# Altium footprint library Connectors.PcbLib: 101 footprints (part 1 of 7)
Each footprint in its own frame and in the unit in brackets; x right, y up, seen from the top. Pads: shape width x height; smd on the part's side, far side on the other; paste and mask are expansions set on the pad; w line width, h text height; cw(c..) or ccw(c..) is an arc to the next point about the centre after c.
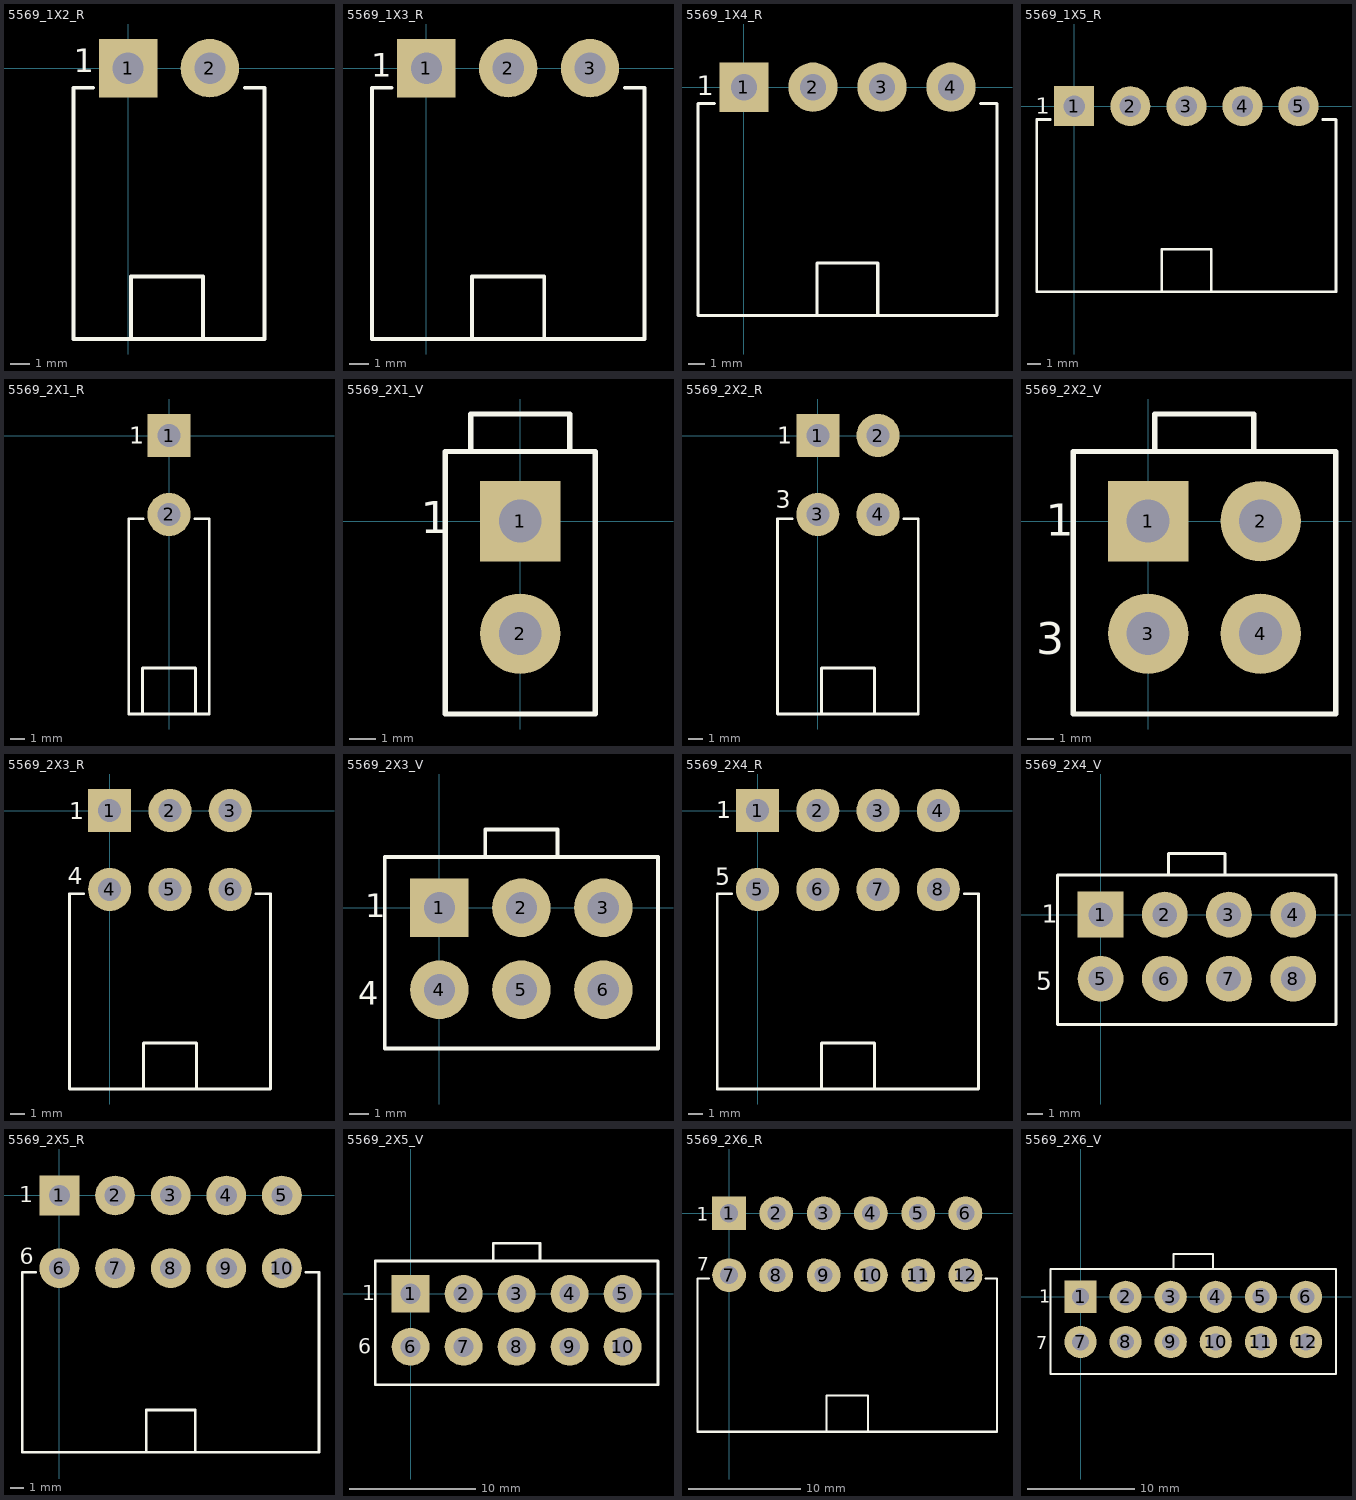
[diagram p0: the footprints below, top view; thin cyan lines are the x and y axes]

## 5569_1X2_R [mm] "5569 Connector, 2-Pin, Single row, Right Angle"
pads (2):
  rect 3x3 hole 1.6 paste+0 mask+0.1: 1(0,0)
  round 3 hole 1.6 paste+0 mask+0.1: 2(4.2,0)
Top Overlay:
  lines w0.2: -1.8,-1 -2.8,-1 -2.8,-13.9 7,-13.9 7,-1 6,-1 ; 0.15,-13.9 0.15,-10.7 3.85,-10.7 3.85,-13.885
  text "1" at -2.79,-0.21 h1.2
3D body: height 6.8, standoff 5.4, extent 0.25,-13.8 3.75,-10.8
3D body: height 5.4, standoff 0, extent -2.7,-13.8 6.9,-1.1

## 5569_1X3_R [mm] "5569 Connector, 3-Pin, Single row, Right Angle"
pads (3):
  rect 3x3 hole 1.6 paste+0 mask+0.1: 1(0,0)
  round 3 hole 1.6 paste+0 mask+0.1: 2(4.2,0) 3(8.4,0)
Top Overlay:
  lines w0.2: -1.8,-1 -2.8,-1 -2.8,-13.9 11.2,-13.9 11.2,-1 10.2,-1 ; 2.35,-13.9 2.35,-10.7 6.05,-10.7 6.05,-13.885
  text "1" at -2.82,-0.44 h1.2
3D body "039303035.stp": height 7.2, standoff -3.6, extent -2.7,-13.8 11.1,0.25

## 5569_1X4_R [mm] "5569 Connector, 4-Pin, Single row, Right Angle"
pads (4):
  rect 3x3 hole 1.6 paste+0 mask+0.1: 1(0,0)
  round 3 hole 1.6 paste+0 mask+0.1: 2(4.2,0) 3(8.4,0) 4(12.6,0)
Top Overlay:
  lines w0.2: -1.8,-1 -2.8,-1 -2.8,-13.9 15.4,-13.9 15.4,-1 14.4,-1 ; 4.45,-13.9 4.45,-10.7 8.15,-10.7 8.15,-13.885
  text "1" at -2.86,-0.48 h1.2
3D body "039303045.stp": height 7.2, standoff -3.5, extent -2.7,-13.8 15.3,0.6

## 5569_1X5_R [mm] "5569 Connector, 5-Pin, Single row, Right Angle"
pads (5):
  rect 3x3 hole 1.6 paste+0 mask+0.1: 1(0,0)
  round 3 hole 1.6 paste+0 mask+0.1: 2(4.2,0) 3(8.4,0) 4(12.6,0) 5(16.8,0)
Top Overlay:
  lines w0.2: -1.8,-1 -2.8,-1 -2.8,-13.9 19.6,-13.9 19.6,-1 18.6,-1 ; 6.55,-13.9 6.55,-10.7 10.25,-10.7 10.25,-13.885
  text "1" at -2.86,-0.57 h1.2
3D body "039303055.stp": height 7.2, standoff -3.5, extent -2.7,-13.8 19.5,0.6

## 5569_2X1_R [mm] "5569 Connector, 1-Pin, Dual row, Right Angle"
pads (2):
  rect 3x3 hole 1.6 paste+0 mask+0.1: 1(0,0)
  round 3 hole 1.6 paste+0 mask+0.1: 2(0,-5.5)
Top Overlay:
  lines w0.2: -1.85,-19.4 -1.85,-16.2 1.85,-16.2 1.85,-19.385 ; -1.8,-5.8 -2.8,-5.8 -2.8,-19.4 2.8,-19.4 2.8,-5.8 1.8,-5.8
  text "1" at -2.76,-0.56 h1.2
3D body "874270202.stp": height 11.4, standoff -3.3, extent -3.3,-19.385 3.3,0.55

## 5569_2X1_V [mm] "5569 Connector, 1-Pin, Dual row, Vertical"
pads (2):
  rect 3x3 hole 1.6 paste+0 mask+0.1: 1(0,0)
  round 3 hole 1.6 paste+0 mask+0.1: 2(0,-4.2)
Top Overlay:
  lines w0.2: -1.85,2.6 -1.85,4 1.85,4 1.85,2.6 ; -2.8,-7.2 -2.8,2.6 2.8,2.6 2.8,-7.2 -2.8,-7.2
  text "1" at -3.71,-0.46 h1.2
3D body "874270242.stp": height 13.5, standoff -3.3, extent -3.3,-7.5 3.3,3.9

## 5569_2X2_R [mm] "5569 Connector, 2-Pin, Dual row, Right Angle"
pads (4):
  rect 3x3 hole 1.6 paste+0 mask+0.1: 1(0,0)
  round 3 hole 1.6 paste+0 mask+0.1: 2(4.2,0) 3(0,-5.5) 4(4.2,-5.5)
Top Overlay:
  lines w0.2: -1.8,-5.8 -2.8,-5.8 -2.8,-19.4 7,-19.4 7,-5.8 6,-5.8 ; 0.25,-19.4 0.25,-16.2 3.95,-16.2 3.95,-19.385
  text "3" at -2.93,-5.02 h1.2
  text "1" at -2.82,-0.58 h1.2
3D body "874270402.stp": height 11.4, standoff -3.3, extent -3.3,-19.385 7.5,0.55

## 5569_2X2_V [mm] "5569 Connector, 2-Pin, Dual row, Vertical"
pads (4):
  rect 3x3 hole 1.6 paste+0 mask+0.1: 1(0,0)
  round 3 hole 1.6 paste+0 mask+0.1: 2(4.2,0) 3(0,-4.2) 4(4.2,-4.2)
Top Overlay:
  lines w0.2: 0.25,2.6 0.25,4 3.95,4 3.95,2.6 ; -2.8,-7.2 -2.8,2.6 7,2.6 7,-7.2 -2.8,-7.2
  text "3" at -4.17,-4.97 h1.2
  text "1" at -3.82,-0.55 h1.2
3D body "874270442.stp": height 13.5, standoff -2.1, extent -3.3,-7.5 7.5,3.9

## 5569_2X3_R [mm] "5569 Connector, 3-Pin, Dual row, Right Angle"
pads (6):
  rect 3x3 hole 1.6 paste+0 mask+0.1: 1(0,0)
  round 3 hole 1.6 paste+0 mask+0.1: 2(4.2,0) 3(8.4,0) 4(0,-5.5) 5(4.2,-5.5) 6(8.4,-5.5)
Top Overlay:
  lines w0.2: -1.8,-5.8 -2.8,-5.8 -2.8,-19.4 11.2,-19.4 11.2,-5.8 10.2,-5.8 ; 2.35,-19.4 2.35,-16.2 6.05,-16.2 6.05,-19.385
  text "4" at -2.93,-5.14 h1.2
  text "1" at -2.81,-0.61 h1.2
3D body "874270602.stp": height 11.4, standoff -3.3, extent -3.3,-19.385 11.7,0.55

## 5569_2X3_V [mm] "5569 Connector, 3-Pin, Dual row, Vertical"
pads (6):
  rect 3x3 hole 1.6 paste+0 mask+0.1: 1(0,0)
  round 3 hole 1.6 paste+0 mask+0.1: 2(4.2,0) 3(8.4,0) 4(0,-4.2) 5(4.2,-4.2) 6(8.4,-4.2)
Top Overlay:
  lines w0.2: 2.35,2.6 2.35,4 6.05,4 6.05,2.6 ; -2.8,-7.2 -2.8,2.6 11.2,2.6 11.2,-7.2 -2.8,-7.2
  text "4" at -4.17,-4.98 h1.2
  text "1" at -3.8,-0.48 h1.2
3D body "874270642.stp": height 13.5, standoff -3.3, extent -3.3,-7.5 11.7,3.9

## 5569_2X4_R [mm] "5569 Connector, 4-Pin, Dual row, Right Angle"
pads (8):
  rect 3x3 hole 1.6 paste+0 mask+0.1: 1(0,0)
  round 3 hole 1.6 paste+0 mask+0.1: 2(4.2,0) 3(8.4,0) 4(12.6,0) 5(0,-5.5) 6(4.2,-5.5) 7(8.4,-5.5) 8(12.6,-5.5)
Top Overlay:
  lines w0.2: -1.8,-5.8 -2.8,-5.8 -2.8,-19.4 15.4,-19.4 15.4,-5.8 14.4,-5.8 ; 4.45,-19.4 4.45,-16.2 8.15,-16.2 8.15,-19.385
  text "1" at -2.87,-0.55 h1.2
  text "5" at -2.93,-5.17 h1.2
3D body "874270802.stp": height 11.4, standoff -3.3, extent -3.3,-19.385 15.9,0.55

## 5569_2X4_V [mm] "5569 Connector, 4-Pin, Dual row, Vertical"
pads (8):
  rect 3x3 hole 1.6 paste+0 mask+0.1: 1(0,0)
  round 3 hole 1.6 paste+0 mask+0.1: 2(4.2,0) 3(8.4,0) 4(12.6,0) 5(0,-4.2) 6(4.2,-4.2) 7(8.4,-4.2) 8(12.6,-4.2)
Top Overlay:
  lines w0.2: 4.45,2.6 4.45,4 8.15,4 8.15,2.6 ; -2.8,-7.2 -2.8,2.6 15.4,2.6 15.4,-7.2 -2.8,-7.2
  text "1" at -3.83,-0.55 h1.2
  text "5" at -4.22,-4.91 h1.2
3D body "874270842.stp": height 13.5, standoff -3.3, extent -3.3,-7.5 15.9,3.9

## 5569_2X5_R [mm] "5569 Connector, 5-Pin, Dual row, Right Angle"
pads (10):
  rect 3x3 hole 1.6 paste+0 mask+0.1: 1(0,0)
  round 3 hole 1.6 paste+0 mask+0.1: 2(4.2,0) 3(8.4,0) 4(12.6,0) 5(16.8,0) 6(0,-5.5) 7(4.2,-5.5) 8(8.4,-5.5) 9(12.6,-5.5) 10(16.8,-5.5)
Top Overlay:
  lines w0.2: -1.8,-5.8 -2.8,-5.8 -2.8,-19.4 19.6,-19.4 19.6,-5.8 18.6,-5.8 ; 6.55,-19.4 6.55,-16.2 10.25,-16.2 10.25,-19.385
  text "6" at -2.98,-5.19 h1.2
  text "1" at -3.05,-0.52 h1.2
3D body "874271002.stp": height 11.4, standoff -3.3, extent -3.3,-19.385 20.1,0.55

## 5569_2X5_V [mm] "5569 Connector, 5-Pin, Dual row, Vertical"
pads (10):
  rect 3x3 hole 1.6 paste+0 mask+0.1: 1(0,0)
  round 3 hole 1.6 paste+0 mask+0.1: 2(4.2,0) 3(8.4,0) 4(12.6,0) 5(16.8,0) 6(0,-4.2) 7(4.2,-4.2) 8(8.4,-4.2) 9(12.6,-4.2) 10(16.8,-4.2)
Top Overlay:
  lines w0.2: 6.55,2.6 6.55,4 10.25,4 10.25,2.6 ; -2.8,-7.2 -2.8,2.6 19.6,2.6 19.6,-7.2 -2.8,-7.2
  text "1" at -3.84,-0.51 h1.2
  text "6" at -4.17,-4.76 h1.2
3D body "874271042.stp": height 13.5, standoff -3.3, extent -3.3,-7.5 20.1,3.9

## 5569_2X6_R [mm] "5569 Connector, 6-Pin, Dual row, Right Angle"
pads (12):
  rect 3x3 hole 1.6 paste+0 mask+0.1: 1(0,0)
  round 3 hole 1.6 paste+0 mask+0.1: 2(4.2,0) 3(8.4,0) 4(12.6,0) 5(16.8,0) 6(21,0) 7(0,-5.5) 8(4.2,-5.5) 9(8.4,-5.5) 10(12.6,-5.5) 11(16.8,-5.5) 12(21,-5.5)
Top Overlay:
  lines w0.2: -1.8,-5.8 -2.8,-5.8 -2.8,-19.4 23.8,-19.4 23.8,-5.8 22.8,-5.8 ; 8.65,-19.4 8.65,-16.2 12.35,-16.2 12.35,-19.385
  text "7" at -2.84,-5.13 h1.2
  text "1" at -2.85,-0.65 h1.2
3D body "874271202.stp": height 11.4, standoff -3.3, extent -3.3,-19.385 24.3,0.55

## 5569_2X6_V [mm] "5569 Connector, 6-Pin, Dual row, Vertical"
pads (12):
  rect 3x3 hole 1.6 paste+0 mask+0.1: 1(0,0)
  round 3 hole 1.6 paste+0 mask+0.1: 2(4.2,0) 3(8.4,0) 4(12.6,0) 5(16.8,0) 6(21,0) 7(0,-4.2) 8(4.2,-4.2) 9(8.4,-4.2) 10(12.6,-4.2) 11(16.8,-4.2) 12(21,-4.2)
Top Overlay:
  lines w0.2: 8.65,2.6 8.65,4 12.35,4 12.35,2.6 ; -2.8,-7.2 -2.8,2.6 23.8,2.6 23.8,-7.2 -2.8,-7.2
  text "7" at -4.15,-4.87 h1.2
  text "1" at -3.87,-0.57 h1.2
3D body "874271242.stp": height 13.5, standoff -3.3, extent -3.3,-7.5 24.3,3.9